# Altium footprint library B-NT_CONNECT.PcbLib: 109 footprints (part 6 of 7)
Each footprint in its own frame and in the unit in brackets; x right, y up, seen from the top. Pads: shape width x height; smd on the part's side, far side on the other; paste and mask are expansions set on the pad; w line width, h text height; cw(c..) or ccw(c..) is an arc to the next point about the centre after c.
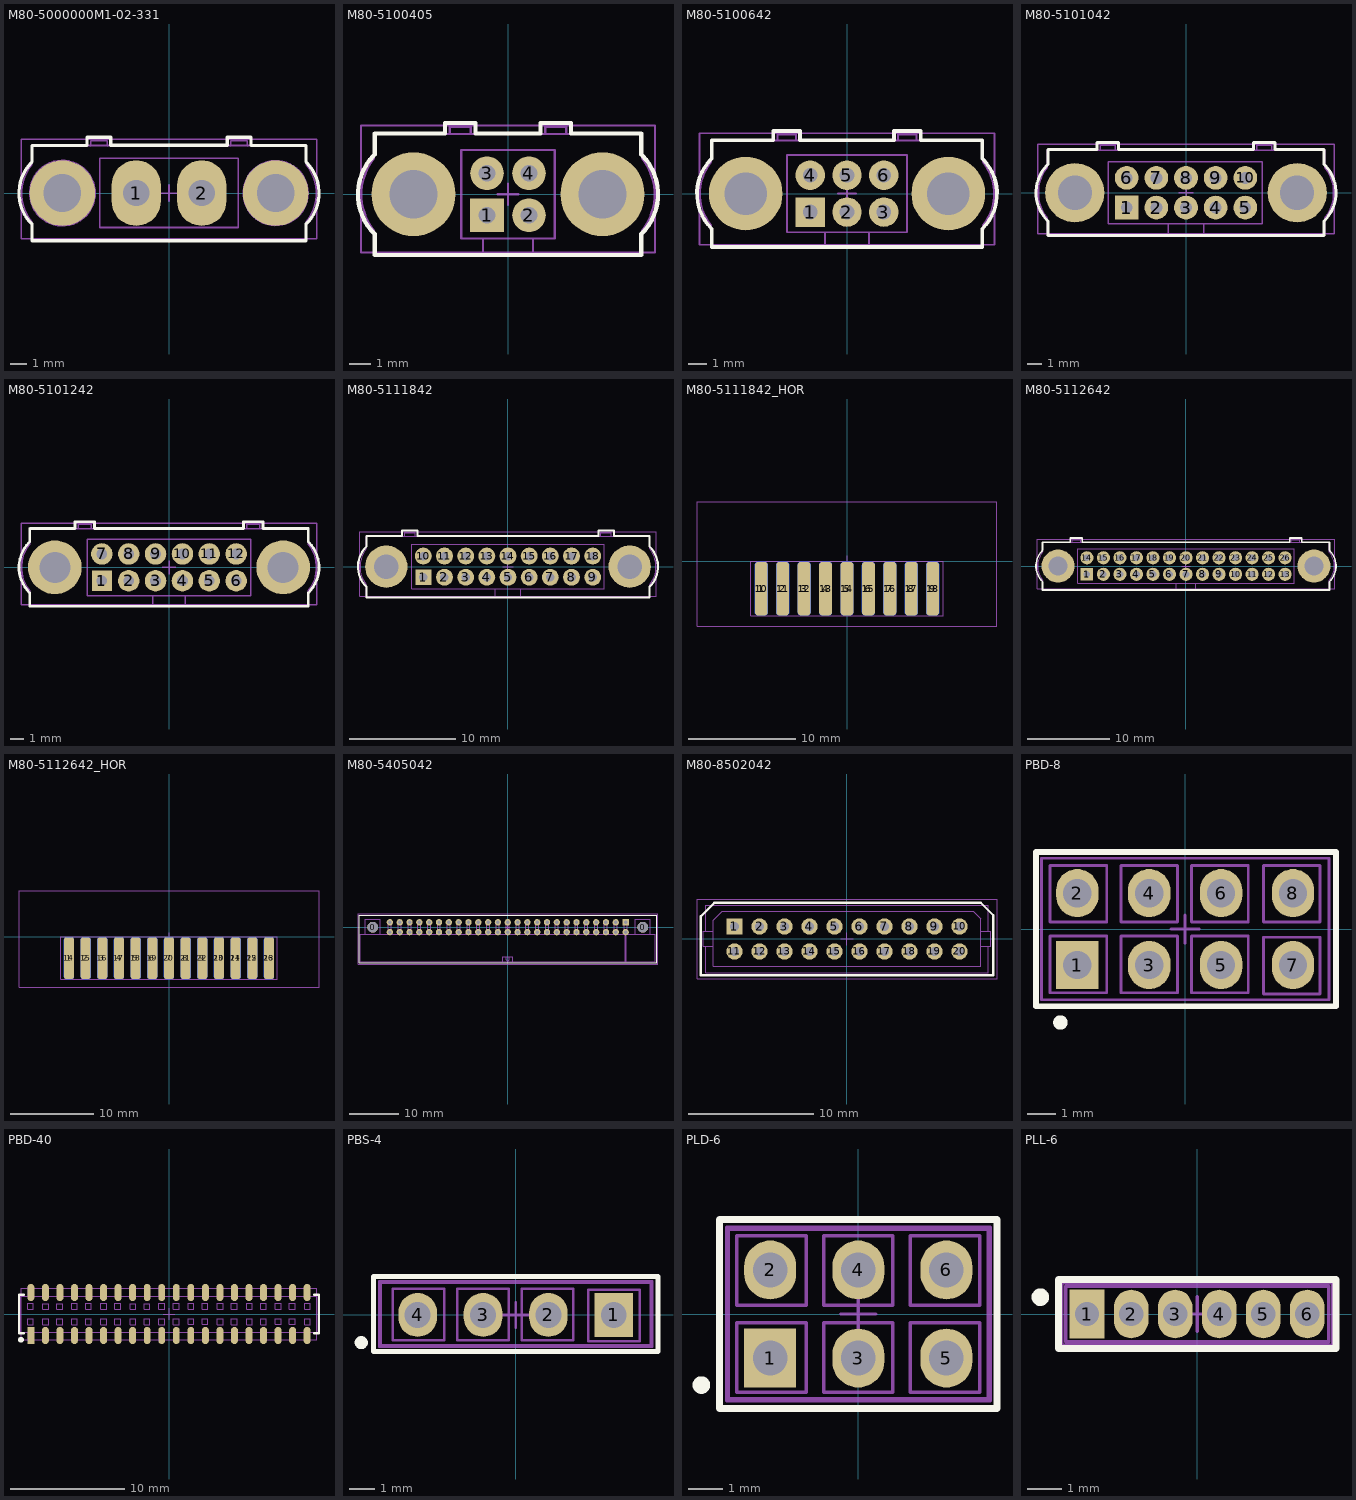
[diagram p5: the footprints below, top view; thin cyan lines are the x and y axes]

## M80-5000000M1-02-331 [mm]
pads (4):
  oval 3x4 hole 1.6: 1(-2,0) 2(2,0)
  round 4 hole 2.3: ""(-6.5,0) ""(6.5,0)
Top Overlay:
  lines w0.2: -8.401,1.849 ccw(c-6.475,0) -8.35,-1.9 -8.35,-2.9 8.35,-2.9 8.35,-1.9 ccw(c6.475,0) 8.401,1.849 ; -8.35,1.9 -8.35,2.875 -8.325,2.9 ; -8.35,2.9 -5.025,2.9 ; -5.001,2.901 -5.001,3.401 -3.551,3.401 -3.551,2.901 ; -3.526,2.926 3.55,2.926 ; 3.55,2.901 3.55,3.401 5,3.401 5,2.901 ; 5.025,2.9 8.35,2.9 ; 8.325,2.9 8.35,2.875 8.35,1.9
M3 Top Assy:
  circle w0.1: c6.5,0.001 r1.219
  circle w0.1: c-6.501,0.001 r1.219
  circle w0.1: c-6.5,0 r2
  circle w0.1: c6.5,0 r1.979
  circle w0.1: c-1.975,0.025 r0.863
  circle w0.1: c2.025,0.025 r0.863
  lines w0.1: -8.375,-2.875 -8.375,-1.725 cw(c-6.229,-0.008) -8.374,1.712 ; -8.375,-2.85 8.375,-2.85 ; -8.375,1.7 -8.375,2.875 ; -8.375,2.9 8.375,2.9 ; -4.776,2.876 -4.776,3.201 -3.776,3.201 -3.776,2.876 ; -4.225,2.1 -4.225,-2.1 4.225,-2.1 4.225,2.1 ; -4.225,2.125 4.225,2.125 ; 3.775,2.876 3.775,3.201 4.775,3.201 4.775,2.876 ; 8.375,-2.875 8.375,-1.725 ; 8.375,1.7 8.375,2.875 ; 8.374,1.712 cw(c6.228,-0.008) 8.376,-1.725
M8 Top Brd Anno:
  lines w0.1: -0.5,0 0.5,0 ; 0,-0.5 0,0.5 ; -9,-2.775 -9,3.275 9,3.275 9,-2.775 -9,-2.775
3D body "M80-5000000M1-02-331.STEP": height 5.65, standoff -3.25, extent -9,-2.775 9,3.275

## M80-5100405 [mm]
pads (6):
  rect 1.6x1.6 hole 0.8: 1(-1,-1)
  round 1.6 hole 0.8: 2(1,-1) 3(-1,1) 4(1,1)
  round 4 hole 2.3: ""(-4.5,0) ""(4.5,0)
Top Overlay:
  lines w0.2: -6.401,1.849 ccw(c-4.475,0) -6.35,-1.9 -6.35,-2.9 6.35,-2.9 6.35,-1.9 ccw(c4.475,0) 6.401,1.849 ; -6.35,1.9 -6.35,2.875 -6.325,2.9 ; -6.35,2.9 -3.025,2.9 ; -3,2.9 -3,3.4 -1.55,3.4 -1.55,2.9 ; -1.55,2.9 1.55,2.9 ; 1.55,2.9 1.55,3.4 3,3.4 3,2.9 ; 3.025,2.9 6.35,2.9 ; 6.325,2.9 6.35,2.875 6.35,1.9
M3 Top Assy:
  circle w0.1: c4.5,0.001 r1.219
  circle w0.1: c-4.501,0.001 r1.219
  circle w0.1: c-1,1 r0.412
  circle w0.1: c1,1 r0.412
  circle w0.1: c1,-1 r0.412
  circle w0.1: c-1,-1 r0.412
  lines w0.1: -6.375,1.7 -6.375,2.875 6.325,2.875 ; -6.374,1.712 ccw(c-4.228,-0.008) -6.376,-1.726 -6.375,-2.875 6.375,-2.875 6.375,-1.726 ccw(c4.228,-0.008) 6.374,1.712 ; -2.775,2.875 -2.775,3.2 -1.775,3.2 -1.775,2.875 ; -1.2,-2.875 -1.2,-2.1 ; 1.2,-2.875 1.2,-2.1 ; 1.775,2.875 1.775,3.2 2.775,3.2 2.775,2.875 ; 6.375,1.7 6.375,2.875 ; -2.225,-2.1 2.225,-2.1 2.225,2.1 -2.225,2.1 -2.225,-2.1
M8 Top Brd Anno:
  lines w0.1: -0.5,0 0.5,0 ; 0,-0.5 0,0.5 ; -7,-2.775 7,-2.775 7,3.275 -7,3.275 -7,-2.775
3D body "m80-5100442_asm.stp": height 5.6, standoff -4.6, extent -7,-2.775 7,3.275

## M80-5100642 [mm]
pads (8):
  rect 1.6x1.6 hole 0.8: 1(-2,-1)
  round 1.6 hole 0.8: 2(0,-1) 3(2,-1) 4(-2,1) 5(0,1) 6(2,1)
  round 4 hole 2.3: ""(-5.5,0) ""(5.5,0)
Top Overlay:
  lines w0.2: -7.401,1.849 ccw(c-5.475,0) -7.35,-1.9 -7.35,-2.9 7.35,-2.9 7.35,-1.9 ccw(c5.475,0) 7.4,1.849 ; -7.35,1.9 -7.35,2.875 -7.325,2.9 ; -7.35,2.9 -4.025,2.9 ; -4,2.9 -4,3.4 -2.55,3.4 -2.55,2.9 ; -2.55,2.9 2.55,2.9 ; 2.55,2.9 2.55,3.4 4,3.4 4,2.9 ; 4.025,2.9 7.35,2.9 ; 7.325,2.9 7.35,2.875 7.35,1.9
M3 Top Assy:
  circle w0.1: c-2,1 r0.412
  circle w0.1: c0,1 r0.412
  circle w0.1: c2,1 r0.412
  circle w0.1: c2,-1 r0.412
  circle w0.1: c0,-1 r0.412
  circle w0.1: c-2,-1 r0.412
  circle w0.1: c-5.5,0 r1.219
  circle w0.1: c5.5,0 r1.219
  lines w0.1: -7.376,-1.726 cw(c-5.228,-0.008) -7.374,1.712 ; -7.375,-1.726 -7.375,-2.875 7.375,-2.875 7.375,-1.726 ccw(c5.228,-0.008) 7.374,1.712 ; -7.375,1.7 -7.375,2.875 7.375,2.875 7.375,1.7 ; -3.775,2.875 -3.775,3.2 -2.775,3.2 -2.775,2.875 ; -1.2,-2.875 -1.2,-2.1 ; 1.2,-2.875 1.2,-2.1 ; 2.775,2.875 2.775,3.2 3.775,3.2 3.775,2.875 ; -3.25,-2.1 3.25,-2.1 3.25,2.1 -3.25,2.1 -3.25,-2.1
M8 Top Brd Anno:
  lines w0.1: -0.5,0 0.5,0 ; 0,-0.5 0,0.5 ; -8,-2.775 8,-2.775 8,3.275 -8,3.275 -8,-2.775
3D body "m80-5000642_asm.stp": height 5.6, standoff -3.25, extent -8,-2.775 8,3.275

## M80-5101042 [mm]
pads (12):
  rect 1.6x1.6 hole 0.8: 1(-4,-1)
  round 1.6 hole 0.8: 2(-2,-1) 3(0,-1) 4(2,-1) 5(4,-1) 6(-4,1) 7(-2,1) 8(0,1) 9(2,1) 10(4,1)
  round 4 hole 2.3: ""(-7.5,0) ""(7.5,0)
Top Overlay:
  lines w0.2: -9.376,1.849 ccw(c-7.45,0) -9.325,-1.9 -9.325,-2.9 9.325,-2.9 9.325,-1.9 ccw(c7.45,0) 9.375,1.849 ; -9.325,1.9 -9.325,2.875 -9.3,2.9 ; -9.325,2.9 -6,2.9 -6,3.4 -4.55,3.4 -4.55,2.9 4.55,2.9 4.55,3.4 6,3.4 6,2.9 9.325,2.9 ; 9.3,2.9 9.325,2.875 9.325,1.9
M3 Top Assy:
  circle w0.1: c7.5,0 r1.219
  circle w0.1: c-7.5,0 r1.219
  circle w0.1: c-4,1 r0.412
  circle w0.1: c-2,1 r0.412
  circle w0.1: c0,1 r0.412
  circle w0.1: c2,1 r0.412
  circle w0.1: c4,1 r0.412
  circle w0.1: c4,-1 r0.412
  circle w0.1: c2,-1 r0.412
  circle w0.1: c0,-1 r0.412
  circle w0.1: c-2,-1 r0.412
  circle w0.1: c-4,-1 r0.412
  lines w0.1: -9.351,-1.726 cw(c-7.203,-0.008) -9.349,1.712 ; -9.35,-1.726 -9.35,-2.875 9.35,-2.875 9.35,-1.726 ; -9.35,1.7 -9.35,2.875 9.325,2.875 ; -5.775,2.875 -5.775,3.2 -4.775,3.2 -4.775,2.875 ; -1.2,-2.875 -1.2,-2.1 ; 1.2,-2.875 1.2,-2.1 ; 4.775,2.875 4.775,3.2 5.775,3.2 5.775,2.875 ; 9.349,1.712 cw(c7.203,-0.008) 9.35,-1.726 ; 9.35,1.7 9.35,2.875 ; -5.25,-2.1 5.15,-2.1 5.15,2.1 -5.25,2.1 -5.25,-2.1
M8 Top Brd Anno:
  lines w0.1: -0.5,0 0.5,0 ; 0,-0.5 0,0.5 ; -10,-2.775 -10,3.275 10,3.275 10,-2.775 -10,-2.775
3D body "m80-5001042_asm.stp": height 5.6, standoff -3.25, extent -10,-2.775 10,3.275

## M80-5101242 [mm]
pads (14):
  rect 1.5x1.5 hole 0.8: 1(-5,-1)
  round 1.6 hole 0.8: 2(-3,-1) 3(-1,-1) 4(1,-1) 5(3,-1) 6(5,-1) 7(-5,1) 8(-3,1) 9(-1,1) 10(1,1) 11(3,1) 12(5,1)
  round 4 hole 2.3: ""(-8.5,0) ""(8.5,0)
Top Overlay:
  lines w0.2: -10.426,1.849 ccw(c-8.5,0) -10.375,-1.9 -10.375,-2.9 10.375,-2.9 10.375,-1.9 ccw(c8.5,0) 10.426,1.849 ; -10.375,1.9 -10.375,2.875 -10.35,2.9 -7,2.9 -7,3.4 -5.55,3.4 -5.55,2.9 5.55,2.9 5.55,3.4 7,3.4 7,2.9 10.375,2.9 ; 10.35,2.9 10.375,2.875 10.375,1.9
M3 Top Assy:
  circle w0.1: c-5,-1 r0.412
  circle w0.1: c-3,-1 r0.412
  circle w0.1: c-1,-1 r0.412
  circle w0.1: c1,-1 r0.412
  circle w0.1: c3,-1 r0.412
  circle w0.1: c5,-1 r0.412
  circle w0.1: c5,1 r0.412
  circle w0.1: c3,1 r0.412
  circle w0.1: c1,1 r0.412
  circle w0.1: c-1,1 r0.412
  circle w0.1: c-3,1 r0.412
  circle w0.1: c-5,1 r0.412
  circle w0.1: c-8.5,0 r1.219
  circle w0.1: c8.5,0 r1.219
  lines w0.1: -10.376,-1.726 cw(c-8.228,-0.008) -10.374,1.712 ; -10.375,-1.726 -10.375,-2.875 10.375,-2.875 10.375,-1.726 ; -10.375,1.7 -10.375,2.875 10.375,2.875 10.375,1.7 ; -6.775,2.875 -6.775,3.2 -5.775,3.2 -5.775,2.875 ; -1.2,-2.875 -1.2,-2.1 ; 1.2,-2.875 1.2,-2.1 ; 5.775,2.875 5.775,3.2 6.775,3.2 6.775,2.875 ; 10.374,1.712 cw(c8.228,-0.008) 10.376,-1.726 ; -6.1,-2.1 6.1,-2.1 6.1,2.1 -6.1,2.1 -6.1,-2.1
M8 Top Brd Anno:
  lines w0.1: -0.5,0 0.5,0 ; 0,-0.5 0,0.5 ; -11,-2.775 11,-2.775 11,3.275 -11,3.275 -11,-2.775
3D body "m80-5101242_asm.stp": height 5.6, standoff -4.6, extent -11,-2.775 11,3.275

## M80-5111842 [mm]
pads (20):
  rect 1.5x1.5 hole 0.8: 1(-8,-1)
  round 1.6 hole 0.8: 2(-6,-1) 3(-4,-1) 4(-2,-1) 5(0,-1) 6(2,-1) 7(4,-1) 8(6,-1) 9(8,-1) 10(-8,1) 11(-6,1) 12(-4,1) 13(-2,1) 14(0,1) 15(2,1) 16(4,1) 17(6,1) 18(8,1)
  round 4 hole 2.3: ""(-11.5,0) ""(11.5,0)
Top Overlay:
  lines w0.2: -13.426,1.849 ccw(c-11.5,0) -13.375,-1.9 ; -13.375,-1.9 -13.375,-2.9 13.375,-2.9 13.375,-1.9 ; -13.375,1.9 -13.375,2.875 -13.35,2.9 -10,2.9 -10,3.4 -8.55,3.4 -8.55,2.9 8.55,2.9 8.55,3.4 10,3.4 10,2.9 13.375,2.9 ; 13.35,2.9 13.375,2.875 13.375,1.9 ; 13.375,-1.9 ccw(c11.5,0) 13.426,1.849
M3 Top Assy:
  circle w0.1: c6,-1 r0.412
  circle w0.1: c6,1 r0.412
  circle w0.1: c8,1 r0.412
  circle w0.1: c8,-1 r0.412
  circle w0.1: c2,-1 r0.412
  circle w0.1: c4,-1 r0.412
  circle w0.1: c4,1 r0.412
  circle w0.1: c2,1 r0.412
  circle w0.1: c11.5,0 r1.219
  circle w0.1: c-11.5,0 r1.219
  circle w0.1: c-8,1 r0.412
  circle w0.1: c-6,1 r0.412
  circle w0.1: c-4,1 r0.412
  circle w0.1: c-2,1 r0.412
  circle w0.1: c0,1 r0.412
  circle w0.1: c0,-1 r0.412
  circle w0.1: c-2,-1 r0.412
  circle w0.1: c-4,-1 r0.412
  circle w0.1: c-6,-1 r0.412
  circle w0.1: c-8,-1 r0.412
  lines w0.1: -13.376,-1.726 cw(c-11.228,-0.008) -13.374,1.712 ; -13.375,-1.726 -13.375,-2.875 13.375,-2.875 13.375,-1.726 ; -13.375,1.7 -13.375,2.875 13.375,2.875 13.375,1.7 ; -9.775,2.875 -9.775,3.2 -8.775,3.2 -8.775,2.875 ; -1.2,-2.875 -1.2,-2.1 ; 1.2,-2.875 1.2,-2.1 ; 8.775,2.875 8.775,3.2 9.775,3.2 9.775,2.875 ; 13.374,1.712 cw(c11.228,-0.008) 13.376,-1.726 ; -9.1,-2.1 -9.1,2.1 9.1,2.1 9.1,-2.1 -9.1,-2.1
M8 Top Brd Anno:
  lines w0.1: -0.5,0 0.5,0 ; 0,-0.5 0,0.5 ; -14,-2.775 -14,3.275 14,3.275 14,-2.775 -14,-2.775
3D body "m80-5111805_asm.stp": height 5.6, standoff -6, extent -14,-2.775 14,3.275

## M80-5111842_HOR [mm]
pads (18):
  rrect50% 1.2x5 smd: 1(-8,-2.575) 2(-6,-2.575) 3(-4,-2.575) 4(-2,-2.575) 5(0,-2.575) 6(2,-2.575) 7(4,-2.575) 8(6,-2.575) 9(8,-2.575)
  rrect50% 1.2x5 smd far side: 10(-8,-2.575) 11(-6,-2.575) 12(-4,-2.575) 13(-2,-2.575) 14(0,-2.575) 15(2,-2.575) 16(4,-2.575) 17(6,-2.575) 18(8,-2.575)
M3 Top Assy:
  lines w0.1: -9,-5.125 9,-5.125 9,0 -9,0 -9,-5.125
M8 Top Brd Anno:
  lines w0.1: -0.5,0 0.5,0 ; 0,-0.5 0,0.5 ; -14,-6.075 -14,5.525 14,5.525 14,-6.075 -14,-6.075
3D body "m80-5111805_asm.stp": height 1.92, standoff -4.13, extent -14,-6.075 14,5.525

## M80-5112642 [mm]
pads (28):
  rect 1.5x1.5 hole 0.8: 1(-12,-1)
  round 1.6 hole 0.8: 2(-10,-1) 3(-8,-1) 4(-6,-1) 5(-4,-1) 6(-2,-1) 7(0,-1) 8(2,-1) 9(4,-1) 10(6,-1) 11(8,-1) 12(10,-1) 13(12,-1) 14(-12,1) 15(-10,1) 16(-8,1) 17(-6,1) 18(-4,1) 19(-2,1) 20(0,1) 21(2,1) 22(4,1) 23(6,1) 24(8,1) 25(10,1) 26(12,1)
  round 4 hole 2.3: ""(-15.5,0) ""(15.5,0)
Top Overlay:
  lines w0.2: -17.426,1.849 ccw(c-15.5,0) -17.375,-1.9 -17.375,-2.9 17.375,-2.9 17.375,-1.9 ccw(c15.5,0) 17.426,1.849 ; -17.375,1.9 -17.375,2.875 -17.35,2.9 -14,2.9 -14,3.4 -12.55,3.4 -12.55,2.9 12.55,2.9 12.55,3.4 14,3.4 14,2.9 17.375,2.9 ; 17.35,2.9 17.375,2.875 17.375,1.9
M3 Top Assy:
  circle w0.1: c-12,-1 r0.412
  circle w0.1: c-10,-1 r0.412
  circle w0.1: c-8,-1 r0.412
  circle w0.1: c-6,-1 r0.412
  circle w0.1: c-4,-1 r0.412
  circle w0.1: c12,-1 r0.412
  circle w0.1: c12,1 r0.412
  circle w0.1: c-4,1 r0.412
  circle w0.1: c-6,1 r0.412
  circle w0.1: c-8,1 r0.412
  circle w0.1: c-10,1 r0.412
  circle w0.1: c-12,1 r0.412
  circle w0.1: c-15.5,0 r1.219
  circle w0.1: c15.5,0 r1.219
  circle w0.1: c-2,1 r0.412
  circle w0.1: c0,1 r0.412
  circle w0.1: c0,-1 r0.412
  circle w0.1: c-2,-1 r0.412
  circle w0.1: c8,1 r0.412
  circle w0.1: c10,1 r0.412
  circle w0.1: c10,-1 r0.412
  circle w0.1: c8,-1 r0.412
  circle w0.1: c4,-1 r0.412
  circle w0.1: c6,-1 r0.412
  circle w0.1: c6,1 r0.412
  circle w0.1: c4,1 r0.412
  circle w0.1: c2,1 r0.412
  circle w0.1: c2,-1 r0.412
  lines w0.1: -17.376,-1.726 cw(c-15.228,-0.008) -17.374,1.712 ; -17.375,-1.726 -17.375,-2.875 17.375,-2.875 17.375,-1.726 ; -17.375,1.7 -17.375,2.875 17.375,2.875 17.375,1.7 ; -13.775,2.875 -13.775,3.2 -12.775,3.2 -12.775,2.875 ; -1.2,-2.875 -1.2,-2.1 ; 1.2,-2.875 1.2,-2.1 ; 12.775,2.875 12.775,3.2 13.775,3.2 13.775,2.875 ; 17.374,1.712 cw(c15.228,-0.008) 17.376,-1.726 ; -13.1,-2.1 13.1,-2.1 13.1,2.1 -13.1,2.1 -13.1,-2.1
M8 Top Brd Anno:
  lines w0.1: -0.5,0 0.5,0 ; 0,-0.5 0,0.5 ; -18,-2.775 -18,3.275 -17.975,3.275 18,3.275 18,-2.775 -18,-2.775
3D body "m80-5112605_asm.stp": height 5.6, standoff -6, extent -18,-2.775 18,3.275

## M80-5112642_HOR [mm]
pads (26):
  rrect50% 1.2x5 smd: 1(-12,-2.575) 2(-10,-2.575) 3(-8,-2.575) 4(-6,-2.575) 5(-4,-2.575) 6(-2,-2.575) 7(0,-2.575) 8(2,-2.575) 9(4,-2.575) 10(6,-2.575) 11(8,-2.575) 12(10,-2.575) 13(12,-2.575)
  rrect50% 1.2x5 smd far side: 14(-12,-2.575) 15(-10,-2.575) 16(-8,-2.575) 17(-6,-2.575) 18(-4,-2.575) 19(-2,-2.575) 20(0,-2.575) 21(2,-2.575) 22(4,-2.575) 23(6,-2.575) 24(8,-2.575) 25(10,-2.575) 26(12,-2.575)
M3 Top Assy:
  lines w0.1: -13,-5.125 13,-5.125 13,0 -13,0 -13,-5.125
M8 Top Brd Anno:
  lines w0.1: -0.5,0 0.5,0 ; 0,-0.5 0,0.5 ; -18,-6.075 18,-6.075 18,5.525 -18,5.525 -18,-6.075
3D body "m80-5112605_asm.stp": height 1.92, standoff -4.13, extent -18,-6.075 18,5.525

## M80-5405042 [mm] "CONN HDR 2MM R/A W/SCREW 50POS"
height 6.05
pads (52):
  round 2.2 hole 2.2 unplated: 0(-27.5,0) 0(27.5,0)
  rect 1.3x1.3 hole 0.7: 1(24,1)
  round 1.3 hole 0.7: 2(22,1) 3(20,1) 4(18,1) 5(16,1) 6(14,1) 7(12,1) 8(10,1) 9(8,1) 10(6,1) 11(4,1) 12(2,1) 13(0,1) 14(-2,1) 15(-4,1) 16(-6,1) 17(-8,1) 18(-10,1) 19(-12,1) 20(-14,1) 21(-16,1) 22(-18,1) 23(-20,1) 24(-22,1) 25(-24,1) 26(24,-1) 27(22,-1) 28(20,-1) 29(18,-1) 30(16,-1) 31(14,-1) 32(12,-1) 33(10,-1) 34(8,-1) 35(6,-1) 36(4,-1) 37(2,-1) 38(0,-1) 39(-2,-1) 40(-4,-1) 41(-6,-1) 42(-8,-1) 43(-10,-1) 44(-12,-1) 45(-14,-1) 46(-16,-1) 47(-18,-1) 48(-20,-1) 49(-22,-1) 50(-24,-1)
Top Overlay:
  lines w0.2: -30.2,-7.2 30.3,-7.2 30.3,2.4 -30.2,2.4 -30.2,-7.2
M3 Top Assy:
  lines w0.1: -29,-1.4 -29,1.6 -26,1.6 -26,-0.4 -26,-1.4 ; -24.3,-1.4 -24.3,1.2 -23.7,1.2 -23.7,-1.4 ; -24.3,-0.8 -23.7,-0.8 ; -22.3,-1.4 -22.3,1.2 -21.7,1.2 -21.7,-1.4 ; -22.3,-0.8 -21.7,-0.8 ; -20.3,-1.4 -20.3,1.2 -19.7,1.2 -19.7,-1.4 ; -20.3,-0.8 -19.7,-0.8 ; -18.3,-1.4 -18.3,1.2 -17.7,1.2 -17.7,-1.4 ; -18.3,-0.8 -17.7,-0.8 ; -16.3,-1.4 -16.3,1.2 -15.7,1.2 -15.7,-1.4 ; -16.3,-0.8 -15.7,-0.8 ; -14.3,-1.4 -14.3,1.2 -13.7,1.2 -13.7,-1.4 ; -14.3,-0.8 -13.7,-0.8 ; -12.3,-1.4 -12.3,1.2 -11.7,1.2 -11.7,-1.4 ; -12.3,-0.8 -11.7,-0.8 ; -10.3,-1.4 -10.3,1.2 -9.7,1.2 -9.7,-1.4 ; -10.3,-0.8 -9.7,-0.8 ; -8.3,-1.4 -8.3,1.2 -7.7,1.2 -7.7,-1.4 ; -8.3,-0.8 -7.7,-0.8 ; -6.3,-1.4 -6.3,1.2 -5.7,1.2 -5.7,-1.4 ; -6.3,-0.8 -5.7,-0.8 ; -4.3,-1.4 -4.3,1.2 -3.7,1.2 -3.7,-1.4 ; -4.3,-0.8 -3.7,-0.8 ; -2.3,-1.4 -2.3,1.2 -1.7,1.2 -1.7,-1.4 ; -2.3,-0.8 -1.7,-0.8 ; -1,-7 -1,-6 1,-6 1,-7 ; -0.3,-6 -0.3,-6.6 -0.1,-6.8 0.1,-6.8 0.3,-6.6 0.3,-6 ; -0.3,-1.4 -0.3,1.2 0.3,1.2 0.3,-1.4 ; -0.3,-0.8 0.3,-0.8 ; 1.7,-1.4 1.7,1.2 2.3,1.2 2.3,-1.4 ; 1.7,-0.8 2.3,-0.8 ; 3.5,-1.4 4.3,-1.4 4.3,1.2 3.7,1.2 3.7,-1.4 ; 3.7,-0.8 4.3,-0.8 ; 5.7,-1.4 5.7,1.2 6.3,1.2 6.3,-1.4 ; 5.7,-0.8 6.3,-0.8 ; 7.7,-1.4 7.7,1.2 8.3,1.2 8.3,-1.4 ; 7.7,-0.8 8.3,-0.8 ; 9.7,-1.4 9.7,1.2 10.3,1.2 10.3,-1.4 ; 9.7,-0.8 10.3,-0.8 ; 11.7,-1.4 11.7,1.2 12.3,1.2 12.3,-1.4 ; 11.7,-0.8 12.3,-0.8 ; 13.7,-1.4 13.7,1.2 14.3,1.2 14.3,-1.4 ; 13.7,-0.8 14.3,-0.8 ; 15.7,-1.4 15.7,1.2 16.3,1.2 16.3,-1.4 ; 15.7,-0.8 16.3,-0.8 ; 17.7,-1.4 17.7,1.2 18.3,1.2 18.3,-1.4 ; 17.7,-0.8 18.3,-0.8 ; 19.7,-1.4 19.7,1.2 20.3,1.2 20.3,-1.4 ; 19.7,-0.8 20.3,-0.8 ; 21.7,-1.4 21.7,1.2 22.3,1.2 22.3,-1.4 ; 21.7,-0.8 22.3,-0.8 ; 23.7,-1.4 23.7,1.2 24.3,1.2 24.3,-1.4 ; 23.7,-0.8 24.3,-0.8 ; 23.9,-7 23.9,-1.4 24.1,-1.4 24.1,-7 ; 26,-1.4 26,1.6 29,1.6 29,-0.4 29,-1.4 ; -30,-7 -30,-1.4 30,-1.4 30,-7 -30,-7
M8 Top Brd Anno:
  lines w0.1: -30.5,-7.5 -30.5,2.7 30.6,2.7 30.6,-7.5 -30.5,-7.5
  lines w0.2: -0.5,0 0.5,0 ; 0,-0.5 0,0.5
3D body "m80-5405042_asm.stp": height 5.98, standoff -3.15, extent -30,-7 30,2.1

## M80-8502042 [mm]
height 5.14
pads (20):
  rect 1.3x1.3 hole 0.7: 1(-9,1)
  round 1.3 hole 0.7: 2(-7,1) 3(-5,1) 4(-3,1) 5(-1,1) 6(1,1) 7(3,1) 8(5,1) 9(7,1) 10(9,1) 11(-9,-1) 12(-7,-1) 13(-5,-1) 14(-3,-1) 15(-1,-1) 16(1,-1) 17(3,-1) 18(5,-1) 19(7,-1) 20(9,-1)
Top Overlay:
  lines w0.2: -11.7,-2.9 11.7,-2.9 11.7,1.9 10.7,2.9 -10.6,2.9 -11.7,1.8 -11.7,-2.9
M3 Top Assy:
  lines w0.1: -11.3,-0.6 -11.3,-2.7 11.3,-2.7 11.3,-0.6 ; -11.3,0.6 -11.3,2.7 11.3,2.7 11.3,0.6 ; -10.7,-0.6 -11.5,-0.6 -11.5,0.6 -10.7,0.6 ; 10.7,-0.6 11.5,-0.6 11.5,0.6 10.7,0.6 ; -10.7,-2.2 -10.7,1.5 -10,2.2 10.1,2.2 10.7,1.6 10.7,-2.2 -10.7,-2.2
M8 Top Brd Anno:
  lines w0.1: -0.5,0 0.5,0 ; 0,-0.5 0,0.5 ; -12,-3.2 -12,3.2 12,3.2 12,-3.2 -12,-3.2
3D body "m80-8502042_asm.stp": height 5, standoff -3.15, extent -11.5,-2.7 11.5,2.7

## PBD-8 [mm]
pads (8):
  rect 1.5x1.7 hole 1: 1(-3.81,-1.27)
  oval 1.5x1.7 hole 1: 2(-3.81,1.27) 3(-1.27,-1.27) 4(-1.27,1.27) 5(1.27,-1.27) 6(1.27,1.27) 7(3.81,-1.27) 8(3.81,1.27)
Top Overlay:
  circle w0.254: c-4.41,-3.3 r0.127
  lines w0.2: -5.27,-2.725 -5.27,2.725 5.33,2.725 5.33,1.363 5.33,-1.363 5.33,-2.725 -5.27,-2.725
M3 Top Assy:
  lines w0.1: -5.07,-2.5 5.08,-2.5 5.08,2.5 -5.07,2.5 -5.07,-2.5 ; -4.77,-2.25 -4.77,-0.25 -2.77,-0.25 -2.77,-2.25 -4.77,-2.25 ; -4.77,0.25 -2.77,0.25 -2.77,2.25 -4.77,2.25 -4.77,0.25 ; -4.06,-1.52 -3.56,-1.52 -3.56,-1.02 -4.06,-1.02 -4.06,-1.52 ; -4.06,1.02 -3.56,1.02 -3.56,1.52 -4.06,1.52 -4.06,1.02 ; -2.27,-2.25 -2.27,-0.25 -0.27,-0.25 -0.27,-2.25 -2.27,-2.25 ; -2.27,0.25 -2.27,2.25 -0.27,2.25 -0.27,0.25 -2.27,0.25 ; -1.52,-1.52 -1.02,-1.52 -1.02,-1.02 -1.52,-1.02 -1.52,-1.52 ; -1.52,1.02 -1.02,1.02 -1.02,1.52 -1.52,1.52 -1.52,1.02 ; 0.23,-2.25 0.23,-0.25 2.23,-0.25 2.23,-2.25 0.23,-2.25 ; 0.23,0.25 0.23,2.25 2.23,2.25 2.23,0.25 0.23,0.25 ; 1.02,-1.52 1.52,-1.52 1.52,-1.02 1.02,-1.02 1.02,-1.52 ; 1.02,1.02 1.52,1.02 1.52,1.52 1.02,1.52 1.02,1.02 ; 2.77,-2.29 4.77,-2.29 4.77,-0.29 2.77,-0.29 2.77,-2.29 ; 2.77,0.25 4.77,0.25 4.77,2.25 2.77,2.25 2.77,0.25 ; 3.56,-1.52 3.56,-1.02 4.06,-1.02 4.06,-1.52 3.56,-1.52 ; 3.56,1.02 3.56,1.52 4.06,1.52 4.06,1.02 3.56,1.02
M8 Top Brd Anno:
  lines w0.1: -0.5,0 0.5,0 ; 0,-0.5 0,0.5 ; -5.07,-2.5 5.08,-2.5 5.08,2.5 -5.07,2.5 -5.07,-2.5
3D body "PBD-8.STEP": height 8.5, standoff -3, extent -5.08,-2.54 5.08,2.54

## PBD-40 [mm]
pads (40):
  rect 0.6x1.5 smd: 1(-12.065,-1.875)
  oval 0.6x1.5 smd: 2(-12.065,1.875) 3(-10.795,-1.875) 4(-10.795,1.875) 5(-9.525,-1.875) 6(-9.525,1.875) 7(-8.255,-1.875) 8(-8.255,1.875) 9(-6.985,-1.875) 10(-6.985,1.875) 11(-5.715,-1.875) 12(-5.715,1.875) 13(-4.445,-1.875) 14(-4.445,1.875) 15(-3.175,-1.875) 16(-3.175,1.875) 17(-1.905,-1.875) 18(-1.905,1.875) 19(-0.635,-1.875) 20(-0.635,1.875) 21(0.635,-1.875) 22(0.635,1.875) 23(1.905,-1.875) 24(1.905,1.875) 25(3.175,-1.875) 26(3.175,1.875) 27(4.445,-1.875) 28(4.445,1.875) 29(5.715,-1.875) 30(5.715,1.875) 31(6.985,-1.875) 32(6.985,1.875) 33(8.255,-1.875) 34(8.255,1.875) 35(9.525,-1.875) 36(9.525,1.875) 37(10.795,-1.875) 38(10.795,1.875) 39(12.065,-1.875) 40(12.065,1.875)
Top Overlay:
  circle w0.254: c-12.93,-2.25 r0.127
  lines w0.2: -12.675,-1.675 -13.1,-1.675 -13.1,1.675 -12.675,1.675 ; 12.675,-1.675 13.1,-1.675 13.1,1.675 12.675,1.675
M3 Top Assy:
  drawing of 288 lines, arcs and shapes, not listed
M8 Top Brd Anno:
  lines w0.1: -0.5,0 0.5,0 ; 0,-0.5 0,0.5 ; -12.925,-2.25 -12.925,2.25 12.925,2.25 12.925,-2.25 -12.925,-2.25
3D body "PBD-1.27-40.STEP": height 4.4, standoff 0, extent -12.93,-2.25 12.93,2.25

## PBS-4 [mm]
pads (4):
  rect 1.5x1.7 hole 1: 1(3.81,0)
  oval 1.5x1.7 hole 1: 2(1.27,0) 3(-1.27,0) 4(-3.81,0)
Top Overlay:
  circle w0.254: c-5.998,-1.075 r0.127
  lines w0.2: -5.525,-1.425 5.525,-1.425 5.525,1.5 -5.525,1.5 -5.525,-1.425
M3 Top Assy:
  lines w0.1: -5.3,-1.23 -5.3,1.3 5.3,1.3 5.3,-1.23 -5.3,-1.23 ; -4.77,-0.98 -2.77,-0.98 -2.77,1.02 -4.77,1.02 -4.77,-0.98 ; -4.32,-0.5 -4.32,0.5 -3.32,0.5 -3.32,-0.5 -4.32,-0.5 ; -2.27,-0.98 -0.27,-0.98 -0.27,1.02 -2.27,1.02 -2.27,-0.98 ; -1.78,-0.5 -1.78,0.5 -0.78,0.5 -0.78,-0.5 -1.78,-0.5 ; 0.23,-0.98 2.23,-0.98 2.23,1.02 0.23,1.02 0.23,-0.98 ; 0.76,-0.5 0.76,0.5 1.76,0.5 1.76,-0.5 0.76,-0.5 ; 2.81,-1.02 4.81,-1.02 4.81,0.98 2.81,0.98 2.81,-1.02 ; 3.3,-0.5 4.3,-0.5 4.3,0.5 3.3,0.5 3.3,-0.5
M8 Top Brd Anno:
  lines w0.1: -0.5,0 0.5,0 ; 0,-0.5 0,0.5 ; -5.25,-1.175 -5.25,1.25 5.25,1.25 5.25,-1.175 -5.25,-1.175
3D body "4_female.STEP": height 8.5, standoff -3.2, extent -5.33,-1.24 5.33,1.3

## PLD-6 [mm]
pads (6):
  rect 1.5x1.7 hole 1: 1(-2.54,-1.27)
  oval 1.5x1.7 hole 1: 2(-2.54,1.27) 3(0,-1.27) 4(0,1.27) 5(2.54,-1.27) 6(2.54,1.27)
Top Overlay:
  circle w0.254: c-4.525,-2.05 r0.127
  lines w0.2: -4,-2.725 -4,2.725 4,2.725 4,-2.725 -4,-2.725
M3 Top Assy:
  lines w0.1: -3.8,-2.5 3.8,-2.5 3.8,2.5 -3.8,2.5 -3.8,-2.5 ; -3.5,-2.25 -3.5,-0.25 -1.5,-0.25 -1.5,-2.25 -3.5,-2.25 ; -3.5,0.25 -1.5,0.25 -1.5,2.25 -3.5,2.25 -3.5,0.25 ; -2.79,-1.52 -2.29,-1.52 -2.29,-1.02 -2.79,-1.02 -2.79,-1.52 ; -2.79,1.02 -2.29,1.02 -2.29,1.52 -2.79,1.52 -2.79,1.02 ; -1,-2.25 -1,-0.25 1,-0.25 1,-2.25 -1,-2.25 ; -1,0.25 -1,2.25 1,2.25 1,0.25 -1,0.25 ; -0.25,-1.52 0.25,-1.52 0.25,-1.02 -0.25,-1.02 -0.25,-1.52 ; -0.25,1.02 0.25,1.02 0.25,1.52 -0.25,1.52 -0.25,1.02 ; 1.5,-2.25 1.5,-0.25 3.5,-0.25 3.5,-2.25 1.5,-2.25 ; 1.5,0.25 1.5,2.25 3.5,2.25 3.5,0.25 1.5,0.25 ; 2.29,-1.52 2.79,-1.52 2.79,-1.02 2.29,-1.02 2.29,-1.52 ; 2.29,1.02 2.79,1.02 2.79,1.52 2.29,1.52 2.29,1.02
M8 Top Brd Anno:
  lines w0.1: -0.5,0 0.5,0 ; 0,-0.5 0,0.5 ; -3.75,-2.45 -3.75,2.45 3.75,2.45 3.75,-2.45 -3.75,-2.45
3D body "PLD-6.STEP": height 10.1, standoff -1.5, extent -3.8,-2.54 3.82,2.54

## PLL-6 [mm]
pads (6):
  rect 1x1.4 hole 0.7: 1(-3.175,0)
  oval 1x1.4 hole 0.7: 2(-1.905,0) 3(-0.635,0) 4(0.635,0) 5(1.905,0) 6(3.175,0)
Top Overlay:
  circle w0.254: c-4.52,0.485 r0.127
  lines w0.2: -4,-1 -4,1 4,1 4,-1 -4,-1
M3 Top Assy:
  lines w0.1: -3.79,-0.8 3.79,-0.8 3.79,0.8 -3.79,0.8 -3.79,-0.8 ; -3.46,-0.285 -3.46,0.215 -2.96,0.215 -2.96,-0.285 -3.46,-0.285 ; -2.14,-0.285 -2.14,0.215 -1.64,0.215 -1.64,-0.285 -2.14,-0.285 ; -0.915,-0.285 -0.915,0.215 -0.415,0.215 -0.415,-0.285 -0.915,-0.285 ; 0.41,-0.29 0.41,0.21 0.91,0.21 0.91,-0.29 0.41,-0.29 ; 1.635,-0.29 1.635,0.21 2.135,0.21 2.135,-0.29 1.635,-0.29 ; 2.935,-0.285 3.435,-0.285 3.435,0.215 2.935,0.215 2.935,-0.285
M8 Top Brd Anno:
  lines w0.1: -0.5,0 0.5,0 ; 0,-0.5 0,0.5 ; -3.9,-0.9 -3.9,0.9 3.9,0.9 3.9,-0.9 -3.9,-0.9
3D body "GRPB061VWVN-RC.STEP": height 4, standoff -2.3, extent -3.81,-1.1 3.81,1.04